# Altium integrated library CC_V1.4.IntLib: 156 symbols (part 2 of 2)
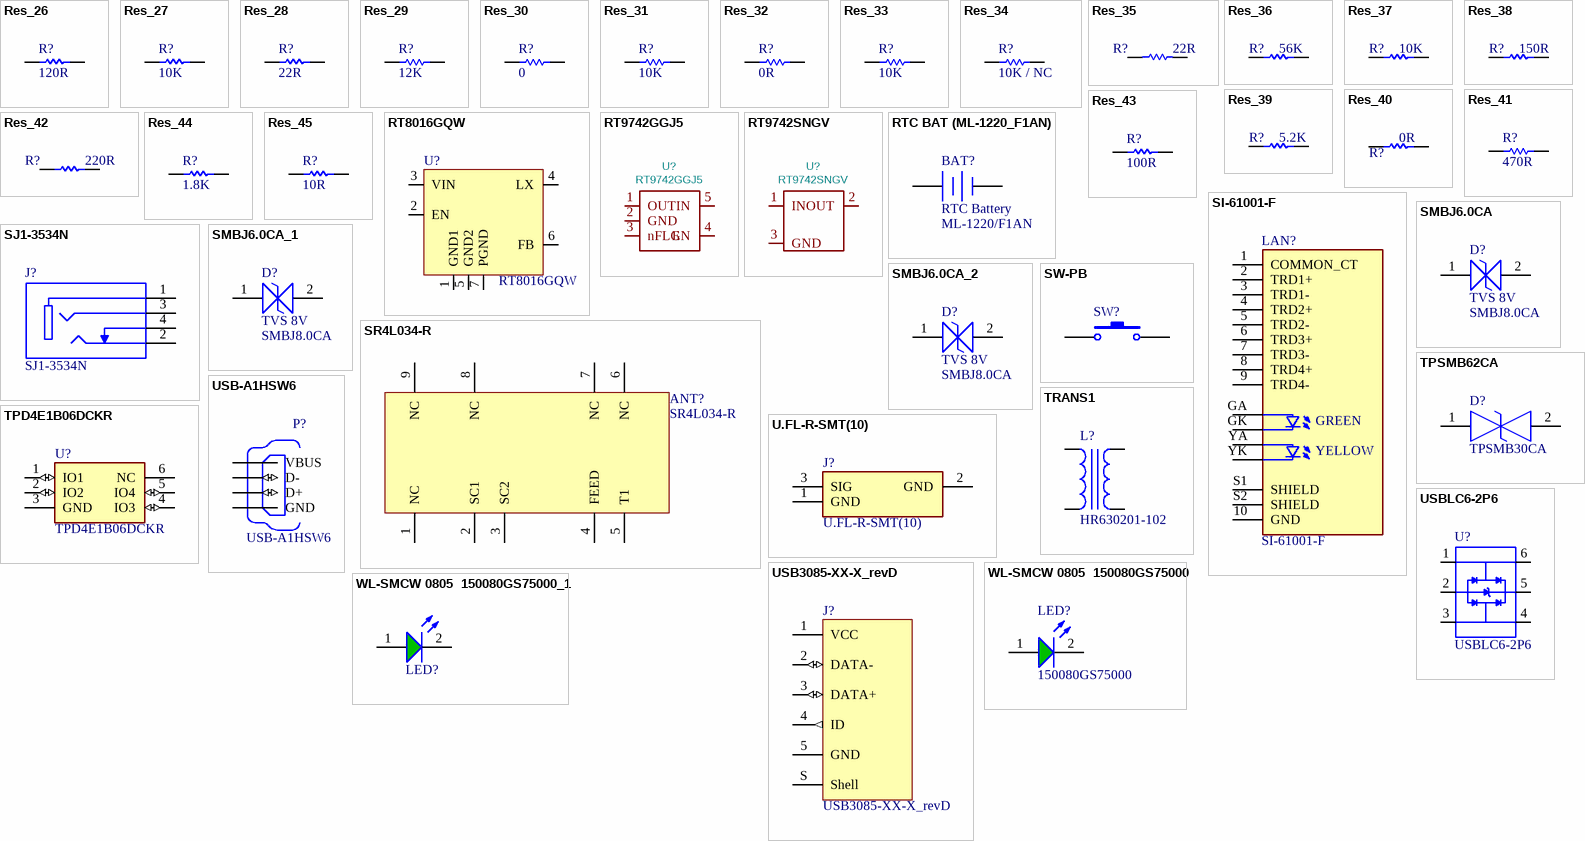
[diagram p7: symbols Res_26 to WL-SMCW 0805  150080GS75000_1]

## SMBJ6.0CA
designator D?, comment TVS 8V  Part Number: SMBJ8.0CA
Bidirectional TVS 8V SMB; Manufacturer_Name: Littelfuse; Datasheet Link: https://www.littelfuse.com/~/media/electronics/datasheets/tvs_diodes/littelfuse_tvs_diode_smbj_datasheet.pdf.pdf; Height: 2.44mm; Link: https://www.digikey.sg/product-detail/en/littelfuse-inc/SMBJ6.0CA/SMBJ6.0CALFCT-ND/286102
footprint DIOM5436X244N (SMB)
pins: 1 K, 2 A

## SMBJ6.0CA_1
designator D?, comment TVS 8V  Part Number: SMBJ8.0CA
Bidirectional TVS 8V SMB; Manufacturer_Name: Littelfuse; Datasheet Link: https://www.littelfuse.com/~/media/electronics/datasheets/tvs_diodes/littelfuse_tvs_diode_smbj_datasheet.pdf.pdf; Height: 2.44mm; Link: https://www.digikey.sg/product-detail/en/littelfuse-inc/SMBJ6.0CA/SMBJ6.0CALFCT-ND/286102
footprint DIOM5436X244N (SMB)
pins: 1 K, 2 A

## SMBJ6.0CA_2
designator D?, comment TVS 8V  Part Number: SMBJ8.0CA
Bidirectional TVS 6V SMB; Manufacturer_Name: Littelfuse; Datasheet Link: https://www.littelfuse.com/~/media/electronics/datasheets/tvs_diodes/littelfuse_tvs_diode_smbj_datasheet.pdf.pdf; Height: 2.44mm; Link: https://www.digikey.sg/product-detail/en/littelfuse-inc/SMBJ6.0CA/SMBJ6.0CALFCT-ND/286102
footprint DIOM5436X244N (SMB)
pins: 1 K, 2 A
2 alternate drawings of the same symbol

## SR4L034-R
designator ANT?, comment Part Number: SR4L034-R  (hidden comment: 4G Antenna)
LTE antenna / Berand        : antenova / partNo Left : SR4L034-L / PartNo Right: SR4L034-R; Link: https://www.digikey.sg/product-detail/en/antenova/SR4L034-R/627-1107-1-ND/9172247
footprint SR4L034-R (antenova SR4L034-R)
pins: 1 NC, 2 SC1, 3 SC2, 4 FEED, 5 T1, 6 NC, 7 NC, 8 NC, 9 NC

## SW-PB
designator SW?
Switch; Published: 24-Mar-1999; LatestRevisionDate: 17-Jul-2002; LatestRevisionNote: Re-released for DXP Platform.; PackageReference: SPST-2; Publisher: Altium Limited; PackageDescription: Switch; 2 Leads
footprint Key_Tak Switch - Push to On
pins: 1, 2

## TPD4E1B06DCKR
designator U?, comment Part Number: TPD4E1B06DCKR  (hidden comment: ESD Protection)
Quad Bi-Directional ESD Protection Array; Manufacturer_Name: Texas Instruments; Datasheet Link: http://www.ti.com/jp/lit/gpn/tpd4e1b06; Height: 1.1mm; Link: https://www.digikey.sg/product-detail/en/texas-instruments/TPD4E1B06DCKR/296-39346-1-ND/5143298
footprint SOT65P210X110-6N (SC70 6L)
pins: 1 IO1 (io), 2 IO2 (io), 3 GND (power), 4 IO3 (io), 5 IO4 (io), 6 NC

## TPSMB62CA
designator D?, comment TPSMB30CA
Partnumber : TPSMB110CA; Manufacturer_Part_Number: TPSMB110CA
footprint DIONM5444X261N
pins: 1, 2
2 alternate drawings of the same symbol

## TRANS1
designator L?, comment HR630201-102
footprint PCBComponent_1 - duplicate
pins: 1, 2, 3, 4

## U.FL-R-SMT(10)
designator J?, comment Part Number: U.FL-R-SMT(10)  (hidden comment: U.FL)
Coaxial Connectors U.FL; Manufacturer_Name: Hirose; Datasheet Link: https://media.digikey.com/pdf/Data%20Sheets/Hirose%20PDFs/UFL%20Series.pdf; Height: 1.25mm; Link: https://www.digikey.sg/product-detail/en/hirose-electric-co-ltd/U.FL-R-SMT-10/H9161CT-ND/2135256
footprint UFLRSMT10
pins: 1 GND, 2 GND, 3 SIG

## USB3085-XX-X_revD
designator J?
Micro USB Receptacle, Type AB, SMT, Horizontal, Bottom Mount, without Peg
footprint USB3085-XX-X_revD (Micro USB Receptacle, Type AB, SMT, Horizontal, Bottom Mount, without Peg)
pins: 1 VCC (power), 2 DATA- (io), 3 DATA+ (io), 4 ID (out), 5 GND (power), S Shell (power)

## USB-A1HSW6
designator P?
USB-A _USB TYPE-A_  Receptacle Connector 4 Position Through Hole, Right Angle; MF: On Shore; SnapEDA_Link: https://www.snapeda.com/parts/USB-A1HSW6/On%20Shore%20Technology%20Inc./view-part/13110/?ref=snap; Package: None; MP: USB-A1HSW6; Availability: Unavailable; Price: None; Value: *
footprint OST_USB-A1HSW6
pins: 1 VBUS (power), 2 D- (io), 3 D+ (io), 4 GND (power)

## USBLC6-2P6
designator U?
17V Clamp 5A _8/20Âµs_ Ipp Tvs Diode Surface Mount SOT-666; MF: STMicroelectronics; Value: *; MP: USBLC6-2P6; SnapEDA_Link: https://www.snapeda.com/parts/USBLC6-2P6/STMicroelectronics/view-part/106846/?ref=snap; Availability: Unavailable; Price: None; Package: SOT-563 STMicroelectronics
footprint SOT50P160X60-6N
pins: 1 I/O1_1 (io), 2 GND (power), 3 I/O2_1 (io), 4 I/O2_2 (io), 5 VBUS (power), 6 I/O1_2 (io)

## WL-SMCW 0805  150080GS75000
designator LED?, comment 150080GS75000
SMD mono-color Chip LED, WL-SMCW, Green; Manufacturer: W黵th Elektronik eiSos GmbH; PartNo: 150080GS75000; ComponentLink1Description: Manufacturer; ComponentLink1URL: http://www.we-online.de; Created by: Christin Otto; Created Date: June 2013; ComponentLink2Description: Datasheet; ComponentLink2URL: http://katalog.we-online.com/led/datasheet/150080GS75000.pdf; Color: Green
footprint LED_0805_Green
pins: 1 A, 2 C

## WL-SMCW 0805  150080GS75000_1
designator LED?, comment 150080GS75000  (value not drawn)
SMD mono-color Chip LED, WL-SMCW, Yellow; Manufacturer: W黵th Elektronik eiSos GmbH; Color: Green; PartNo: 150080GS75000; ComponentLink1Description: Manufacturer; ComponentLink1URL: http://www.we-online.de; Created by: Christin Otto; Created Date: June 2013; ComponentLink2Description: Datasheet; ComponentLink2URL: http://katalog.we-online.com/led/datasheet/150080GS75000.pdf
footprint LED_0805_Green (Chip LED, 2-Leads, Body 2.0x1.3mm, IPC Medium Density)
pins: 1 A, 2 C

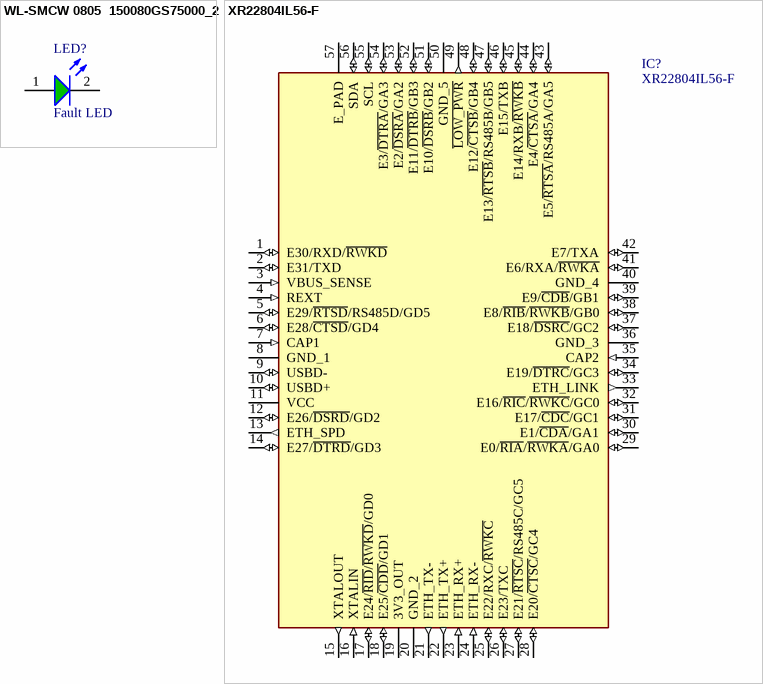
[diagram p6: symbols WL-SMCW 0805  150080GS75000_2 to XR22804IL56-F]

## WL-SMCW 0805  150080GS75000_2
designator LED?, comment Fault LED
SMD mono-color Chip LED, WL-SMCW, Green; PartNo: 150080GS75000; Manufacturer: W黵th Elektronik eiSos GmbH; ComponentLink1Description: Manufacturer; ComponentLink1URL: http://www.we-online.de; Created by: Christin Otto; Created Date: June 2013; ComponentLink2Description: Datasheet; ComponentLink2URL: http://katalog.we-online.com/led/datasheet/150080GS75000.pdf; Color: Green
footprint LED_0805_Green
pins: 1 A, 2 C

## XR22804IL56-F
designator IC?
Integrated Circuit; Manufacturer_Name: EXAR; Datasheet Link: https://www.exar.com/ds/xr22804_1b_04152015.pdf; Height: 1mm; Manufacturer_Part_Number: XR22804IL56-F; Mouser Part Number: 701-22804IL56-F; Mouser Price/Stock: https://www.mouser.com/Search/Refine.aspx?Keyword=701-22804IL56-F; Arrow Part Number: XR22804IL56-F; Arrow Price/Stock: https://www.arrow.com/en/products/xr22804il56-f/exar
footprint QFN50P800X800X100-57N
footprint QFN50P800X800X90-57N
pins: 1 E30/RXD/~{RWKD} (io), 2 E31/TXD (io), 3 VBUS_SENSE (in), 4 REXT (in), 5 E29/~{RTSD}/RS485D/GD5 (io), 6 E28/~{CTSD}/GD4 (io), 7 CAP1 (in), 8 GND_1 (power), 9 USBD- (io), 10 USBD+ (io), 11 VCC (power), 12 E26/~{DSRD}/GD2 (io), 13 ETH_SPD (out), 14 E27/~{DTRD}/GD3 (io), 15 XTALOUT (out), 16 XTALIN (in), 17 E24/~{RID}/~{RWKD}/GD0 (io), 18 E25/~{CDD}/GD1 (io), 19 3V3_OUT (power), 20 GND_2 (power), 21 ETH_TX- (out), 22 ETH_TX+ (out), 23 ETH_RX+ (in), 24 ETH_RX- (in), 25 E22/RXC/~{RWKC} (io), 26 E23/TXC (io), 27 E21/~{RTSC}/RS485C/GC5 (io), 28 E20/~{CTSC}/GC4 (io), 29 E0/~{RIA}/~{RWKA}/GA0 (io), 30 E1/~{CDA}/GA1 (io), 31 E17/~{CDC}/GC1 (io), 32 E16/~{RIC}/~{RWKC}/GC0 (io), 33 ETH_LINK (out), 34 E19/~{DTRC}/GC3 (io), 35 CAP2 (in), 36 GND_3 (power), 37 E18/~{DSRC}/GC2 (io), 38 E8/~{RIB}/~{RWKB}/GB0 (io), 39 E9/~{CDB}/GB1 (io), 40 GND_4 (power), 41 E6/RXA/~{RWKA} (io), 42 E7/TXA (io), 43 E5/~{RTSA}/RS485A/GA5 (io), 44 E4/~{CTSA}/GA4 (io), 45 E14/RXB/~{RWKB} (io), 46 E15/TXB (io), 47 E13/~{RTSB}/RS485B/GB5 (io), 48 E12/~{CTSB}/GB4 (io), 49 ~{LOW_PWR} (out), 50 GND_5 (power), 51 E10/~{DSRB}/GB2 (io), 52 E11/~{DTRB}/GB3 (io), 53 E2/~{DSRA}/GA2 (io), 54 E3/~{DTRA}/GA3 (io), 55 SCL (io), 56 SDA (io), 57 E_PAD (power)